# Altium footprint library DIP Component.PcbLib: 327 footprints (part 17 of 21)
Each footprint in its own frame and in the unit in brackets; x right, y up, seen from the top. Pads: shape width x height; smd on the part's side, far side on the other; paste and mask are expansions set on the pad; w line width, h text height; cw(c..) or ccw(c..) is an arc to the next point about the centre after c.
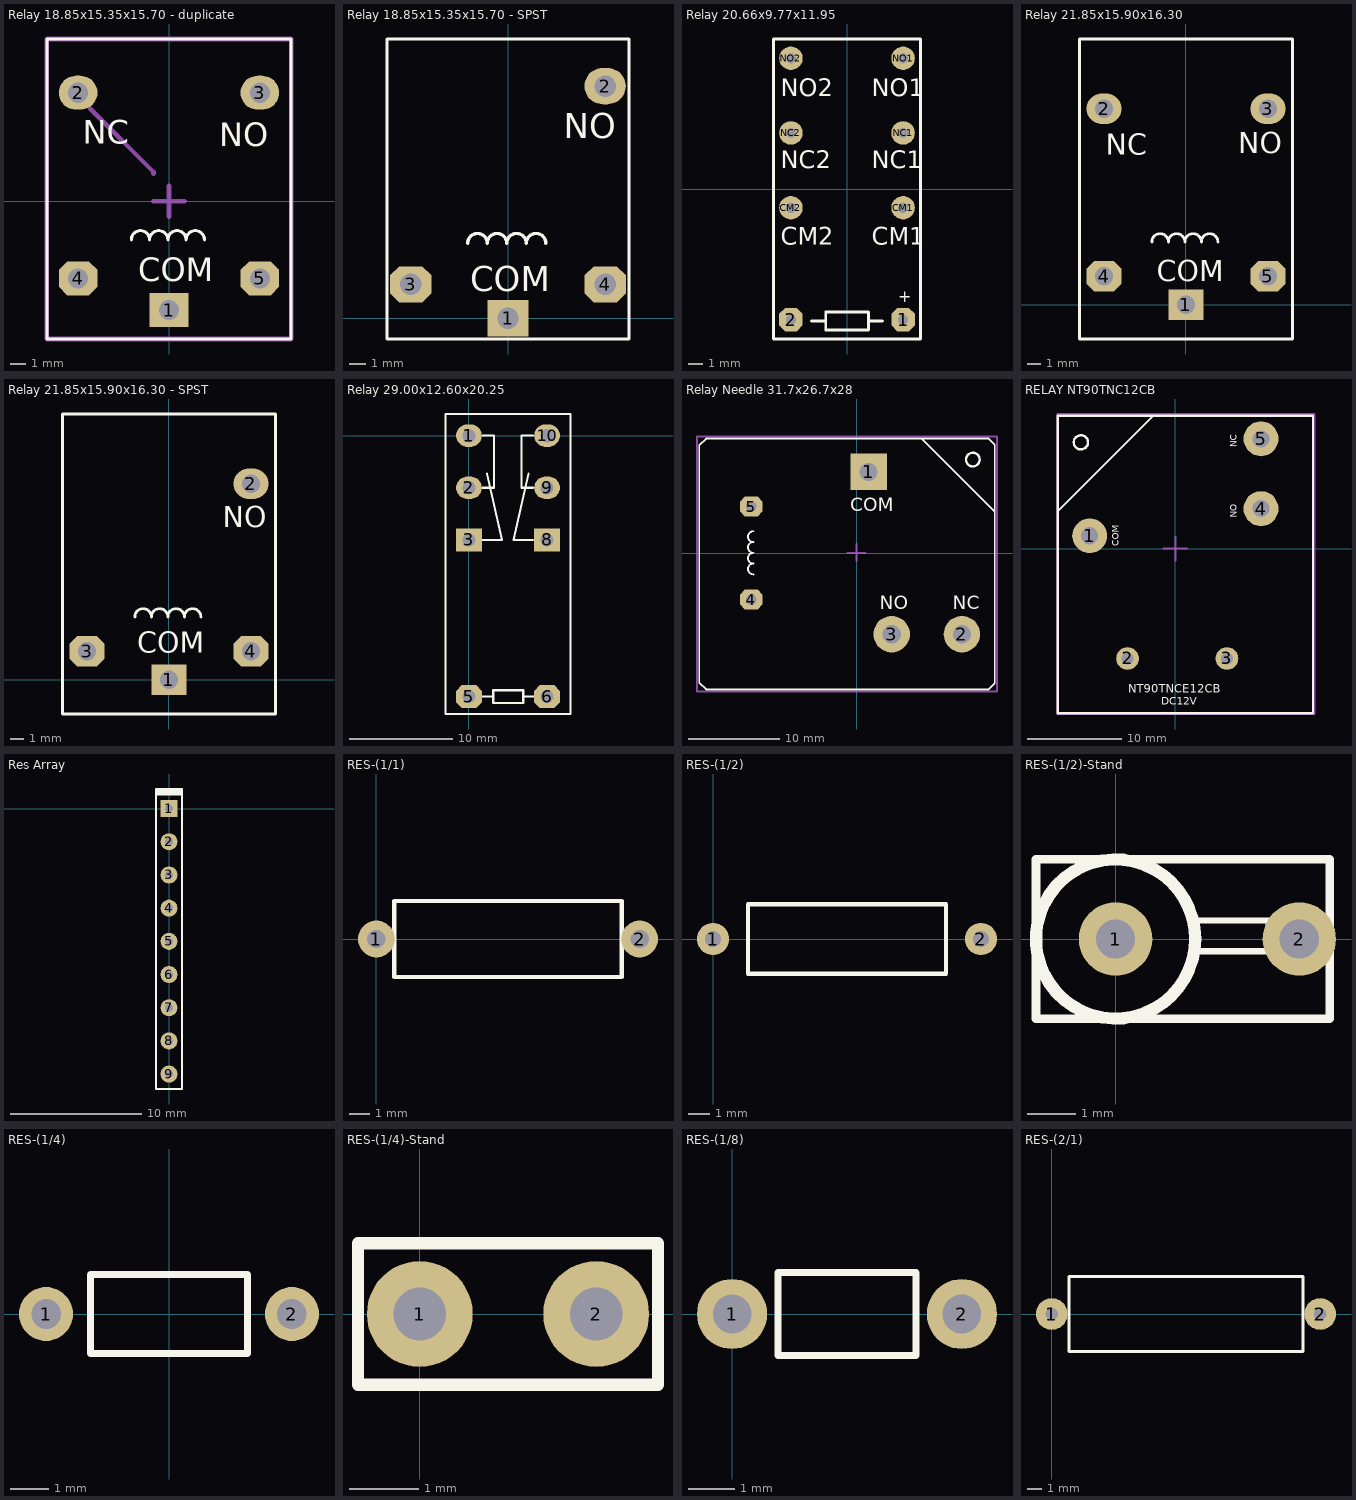
[diagram p16: the footprints below, top view; thin cyan lines are the x and y axes]

## Relay 18.85x15.35x15.70 - duplicate [mm] "DESIGNER ABBAS BASEREH"
height 15.7
pads (5):
  rect 2.5x2.2 hole 1.3: 1(0,-7.025)
  oval 2.5x2.2 hole 1.3: 2(-5.875,7.025) 3(5.875,7.025)
  oct 2.5x2.2 hole 1.3: 4(-5.875,-4.975) 5(5.875,-4.975)
Top Overlay:
  lines w0.2: -2.438,-2.48 cw(c-1.847,-2.48) -1.256,-2.48 cw(c-0.665,-2.48) -0.074,-2.48 cw(c0.517,-2.48) 1.108,-2.48 cw(c1.699,-2.48) 2.29,-2.48 ; -7.9,-8.9 7.9,-8.9 7.9,10.5 -7.9,10.5 -7.9,-8.9
  text "NC" at -5.588,3.734 h1.5
  text "NO" at 3.251,3.556 h1.5
  text "COM" at -1.981,-5.182 h1.5
Mechanical 15:
  lines w0.3: -5.1,6 -1,1.9 -1,1.8 ; -1,0 1,0 ; 0,-1 0,1 ; -7.9,-8.9 7.9,-8.9 7.9,10.5 -7.9,10.5 -7.9,-8.9
3D body "User Library-Relay SPDT.STEP": height 15.6, standoff -3.8, extent -7.75,-8.7 7.75,10.3

## Relay 18.85x15.35x15.70 - SPST [mm]
height 15.7
pads (4):
  rect 2.5x2.2 hole 1.3: 1(0,0)
  oval 2.5x2.2 hole 1.3: 2(5.875,14.05)
  oct 2.5x2.2 hole 1.3: 3(-5.875,2.05) 4(5.875,2.05)
Top Overlay:
  lines w0.2: -2.438,4.545 cw(c-1.847,4.545) -1.256,4.545 cw(c-0.665,4.545) -0.074,4.545 cw(c0.517,4.545) 1.108,4.545 cw(c1.699,4.545) 2.29,4.545 ; -7.325,-1.25 -7.325,16.9 7.325,16.9 7.325,-1.25 -7.325,-1.25
  text "COM" at -2.278,1.628 h1.5
  text "NO" at 3.361,10.899 h1.5

## Relay 20.66x9.77x11.95 [mm]
height 11.95
pads (8):
  oct 1.6x1.6 hole 0.7: 1(3.81,-8.89) 2(-3.81,-8.89)
  round 1.6 hole 0.7: CM1(3.81,-1.27) CM2(-3.81,-1.27) NC1(3.81,3.81) NC2(-3.81,3.81) NO1(3.81,8.89) NO2(-3.81,8.89)
Top Overlay:
  lines w0.2: -2.4,-8.98 -1.447,-8.98 ; 1.472,-8.98 2.4,-8.98 ; -5,-10.2 5,-10.2 5,10.2 -5,10.2 -5,-10.2 ; -1.447,-9.59 1.472,-9.59 1.472,-8.371 -1.447,-8.371 -1.447,-9.59
  text "CM2" at -4.5,-3.8 h1.2
  text "NC2" at -4.5,1.4 h1.2
  text "NO2" at -4.5,6.3 h1.2
  text "NO1" at 1.7,6.3 h1.2
  text "NC1" at 1.7,1.4 h1.2
  text "CM1" at 1.7,-3.8 h1.2
  text "+" at 3.5,-7.7 h0.8
3D body "OMROM G5V-2 DPDT Mini Relay -TH.STEP": height 11, standoff -3.7, extent -4.925,-10.1 4.925,10.1

## Relay 21.85x15.90x16.30 [mm]
height 16.3
pads (5):
  rect 2.5x2.2 hole 1.3: 1(0,0)
  oval 2.5x2.2 hole 1.3: 2(-5.875,14.05) 3(5.875,14.05)
  oct 2.5x2.2 hole 1.3: 4(-5.875,2.05) 5(5.875,2.05)
Top Overlay:
  lines w0.2: -2.445,4.51 cw(c-1.854,4.51) -1.263,4.51 cw(c-0.672,4.51) -0.081,4.51 cw(c0.51,4.51) 1.101,4.51 cw(c1.692,4.51) 2.283,4.51 ; -7.625,-2.45 -7.625,19.05 7.625,19.05 7.625,-2.45 -7.625,-2.45
  text "COM" at -2.09,1.706 h1.5
  text "NO" at 3.752,10.875 h1.5
  text "NC" at -5.748,10.748 h1.5

## Relay 21.85x15.90x16.30 - SPST [mm]
height 16.3
pads (4):
  rect 2.5x2.2 hole 1.3: 1(0,0)
  oval 2.5x2.2 hole 1.3: 2(5.875,14.05)
  oct 2.5x2.2 hole 1.3: 3(-5.875,2.05) 4(5.875,2.05)
Top Overlay:
  lines w0.2: -2.445,4.51 cw(c-1.854,4.51) -1.263,4.51 cw(c-0.672,4.51) -0.081,4.51 cw(c0.51,4.51) 1.101,4.51 cw(c1.692,4.51) 2.283,4.51 ; -7.625,-2.45 -7.625,19.05 7.625,19.05 7.625,-2.45 -7.625,-2.45
  text "COM" at -2.278,1.95 h1.5
  text "NO" at 3.869,10.941 h1.5

## Relay 29.00x12.60x20.25 [mm]
height 20.25
pads (8):
  oval 2.5x2.2 hole 1.3: 1(0,0) 2(0,-5.08) 9(7.6,-5.08) 10(7.6,0)
  rect 2.5x2.2 hole 1.3: 3(0,-10.16) 8(7.6,-10.16)
  oct 2.5x2.2 hole 1.3: 5(0,-25.4) 6(7.6,-25.4)
Top Overlay:
  lines w0.2: 1.32,-25.4 2.364,-25.4 ; 1.32,-10.16 3.195,-10.16 1.752,-3.708 ; 1.32,-5.08 2.42,-5.08 2.42,0 1.32,0 ; 5.282,-25.4 6.324,-25.4 ; 5.786,-3.708 4.343,-10.16 6.218,-10.16 ; 6.22,-5.08 5.12,-5.08 5.12,0 6.22,0 ; -2.3,-27.1 -2.3,2.1 9.9,2.1 9.9,-27.1 -2.3,-27.1 ; 2.364,-26.01 5.282,-26.01 5.282,-24.79 2.364,-24.79 2.364,-26.01

## Relay Needle 31.7x26.7x28 [mm] "DESIGNER ABBAS BASEREH"
height 28
pads (5):
  rect 4x4 hole 2: 1(1.31,8.9)
  round 4 hole 2: 2(11.55,-8.9) 3(3.85,-8.9)
  oct 2.5x2.2 hole 1.2: 4(-11.55,-5.1) 5(-11.55,5.1)
Top Overlay:
  circle w0.254: c12.75,10.25 r0.75
  lines w0.2: -11.32,-2.338 cw(c-11.32,-1.747) -11.32,-1.156 cw(c-11.32,-0.565) -11.32,0.026 cw(c-11.32,0.617) -11.32,1.208 cw(c-11.32,1.799) -11.32,2.39 ; 7.15,12.55 15.15,4.55 ; -17.25,-14.2 -16.5,-14.95 14.5,-14.95 15.15,-14.3 15.15,11.9 14.5,12.55 -16.5,12.55 -17.25,11.8 -17.25,-14.2
  text "COM" at -0.7,4.6 h1.5
  text "NO" at 2.55,-6.15 h1.5
  text "NC" at 10.55,-6.15 h1.5
Mechanical 15:
  lines w0.2: -1,0 1,0 ; 0,-0.9 0,1 ; -17.5,-15.2 15.4,-15.2 15.4,12.8 -17.5,12.8 -17.5,-15.2
3D body "AZ2100_1C-XXXX_POWER RELAY.SLDPRT": height 28.04, standoff -3.46, extent -17.179,-14.932 15.079,12.5

## RELAY NT90TNC12CB [mm] "31.7x26.7x28 DESIGNER:ABBAS BASEREH"
height 28
pads (5):
  round 3.7 hole 1.8: 1(-9.068,1.365) 4(9.068,4.235) 5(9.068,11.626)
  round 2.4 hole 1.3: 2(-5.062,-11.626) 3(5.46,-11.626)
Top Overlay:
  circle w0.254: c-10,11.25 r0.75
  lines w0.2: -12.433,4.1 -12.3,4.1 -2.4,14
  lines w0.254: -12.433,-17.431 -12.433,14.069 14.567,14.069 14.567,-17.431 -12.433,-17.431
  text "NC" at 6.5,10.75 h0.7
  text "NO" at 6.5,3.25 h0.7
  text "COM" at -6,0.25 h0.7
  text "DC12V" at -1.5,-16.5 h0.8
  text "NT90TNCE12CB" at -5,-15.25 h0.9
Mechanical 15:
  lines w0.2: -1.25,0 1.25,0 ; 0,-1.25 0,1.25 ; -12.5,-17.5 -12.5,14.25 14.75,14.25 14.75,-17.5 -12.5,-17.5
3D body "relay.STEP": height 27.76, standoff -5.44, extent -12.425,-17.425 14.575,14.075

## Res Array [mm]
pads (9):
  rect 1.3x1.3 hole 0.6: 1(0,0)
  round 1.3 hole 0.6: 2(0,-2.54) 3(0,-5.08) 4(0,-7.62) 5(0,-10.16) 6(0,-12.7) 7(0,-15.24) 8(0,-17.78) 9(0,-20.32)
Top Overlay:
  rectangle: -1,1 1,1.5
  lines w0.178: -1,-21.463 -1,1.5 1,1.5 1,-21.463 -1,-21.463
3D body "SW3dPS-80015102.step": height 5.4, standoff -3.1, extent -0.625,-21.375 0.625,1.125

## RES-(1/1) [mil]
pads (2):
  round 70 hole 35: 1(0,0) 2(500,0)
Top Overlay:
  lines w7.87: 34,-72 466,-72 466,72 34,72 34,-72
3D body "Res_Normal (1W).STEP": height 150.74, standoff -78.74, extent -10.5,-71 514.5,73

## RES-(1/2) [mil]
pads (2):
  round 60 hole 30: 1(0,0) 2(500,0)
Top Overlay:
  lines w7.87: 65,-65 435,-65 435,65 65,65 65,-65
3D body: height 82.5, standoff 57.5, extent 487.63,-12.44 512.5,12.45
3D body: height 70, standoff -80, extent 487.6,-12.47 512.5,12.48
3D body: height 82.5, standoff 57.5, extent -12.37,-12.44 12.5,12.45
3D body: height 82.4, standoff 57.5, extent 0,-12.48 500,12.48
3D body: height 70, standoff -80, extent -12.4,-12.47 12.5,12.48
3D body: height 134.49, standoff 5, extent 65,-65 435,64.74
3D body: height 135.48, standoff 4, extent 225,-66 255,65.74
3D body: height 135.48, standoff 4, extent 100,-66 130,65.74
3D body: height 135.48, standoff 4, extent 162.5,-66 192.5,65.74
3D body: height 135.48, standoff 4, extent 365,-66 395,65.74

## RES-(1/2)-Stand [mil]
pads (2):
  round 60 hole 32: 1(0,0) 2(150,0)
Top Overlay:
  circle w10: c0,0 r65
  lines w5: 65,-10 125,-10 125,15 65,15
  lines w7: -65,-65 -65,65 175,65 175,-65 -65,-65
3D body: height 350, standoff 320, extent -65.48,-65.87 66,65.87
3D body: height 180, standoff 150, extent -65.48,-65.87 66,65.87
3D body: height 130, standoff 100, extent -65.48,-65.87 66,65.87
3D body: height 80, standoff 50, extent -65.48,-65.87 66,65.87
3D body: height 433, standoff 407, extent 137.14,-12.95 163,12.94
3D body: height 420, standoff -80, extent -12.89,-12.97 13,12.98
3D body: height 380, standoff 20, extent -64.48,-64.87 65,64.87
3D body: height 432.9, standoff 407, extent 0,-12.97 150,12.97
3D body: height 420, standoff -80, extent 137.11,-12.97 163.01,12.98
3D body: height 433, standoff 407, extent -12.86,-12.94 13,12.95

## RES-(1/4) [mil]
pads (2):
  round 55 hole 30: 1(-125,0) 2(125,0)
Top Overlay:
  lines w7.09: -80,-40 80,-40 80,40 -80,40 -80,-40
3D body "Res_Normal (0.25W).STEP": height 115.05, standoff -39.37, extent -135,-36.48 135,36

## RES-(1/4)-Stand [mil]
pads (2):
  round 60 hole 30: 1(0,0) 2(100,0)
Top Overlay:
  lines w7: -35,-40 -35,40 135,40 135,-40 -35,-40
3D body "Res 0.25W_Stand.STEP": height 287.32, standoff -57.17, extent -35.08,-35.48 111.08,37

## RES-(1/8) [mil]
pads (2):
  round 60 hole 33: 1(0,0) 2(196.85,0)
Top Overlay:
  lines w5.91: 39.37,-35.43 157.48,-35.43 157.48,35.43 39.37,35.43 39.37,-35.43
3D body "Res_18.STEP": height 76.63, standoff -32.9, extent -9.84,-31.5 206.69,29.14

## RES-(2/1) [mm]
pads (2):
  round 2.2 hole 0.85: 1(0,0) 2(18.6,0)
Top Overlay:
  lines w0.2: 1.2,-2.6 1.2,2.6 17.4,2.6 17.4,-2.6 1.2,-2.6